# Altium footprint library Connectors.PcbLib: 117 footprints (part 6 of 8)
Each footprint in its own frame and in the unit in brackets; x right, y up, seen from the top. Pads: shape width x height; smd on the part's side, far side on the other; paste and mask are expansions set on the pad; w line width, h text height; cw(c..) or ccw(c..) is an arc to the next point about the centre after c.
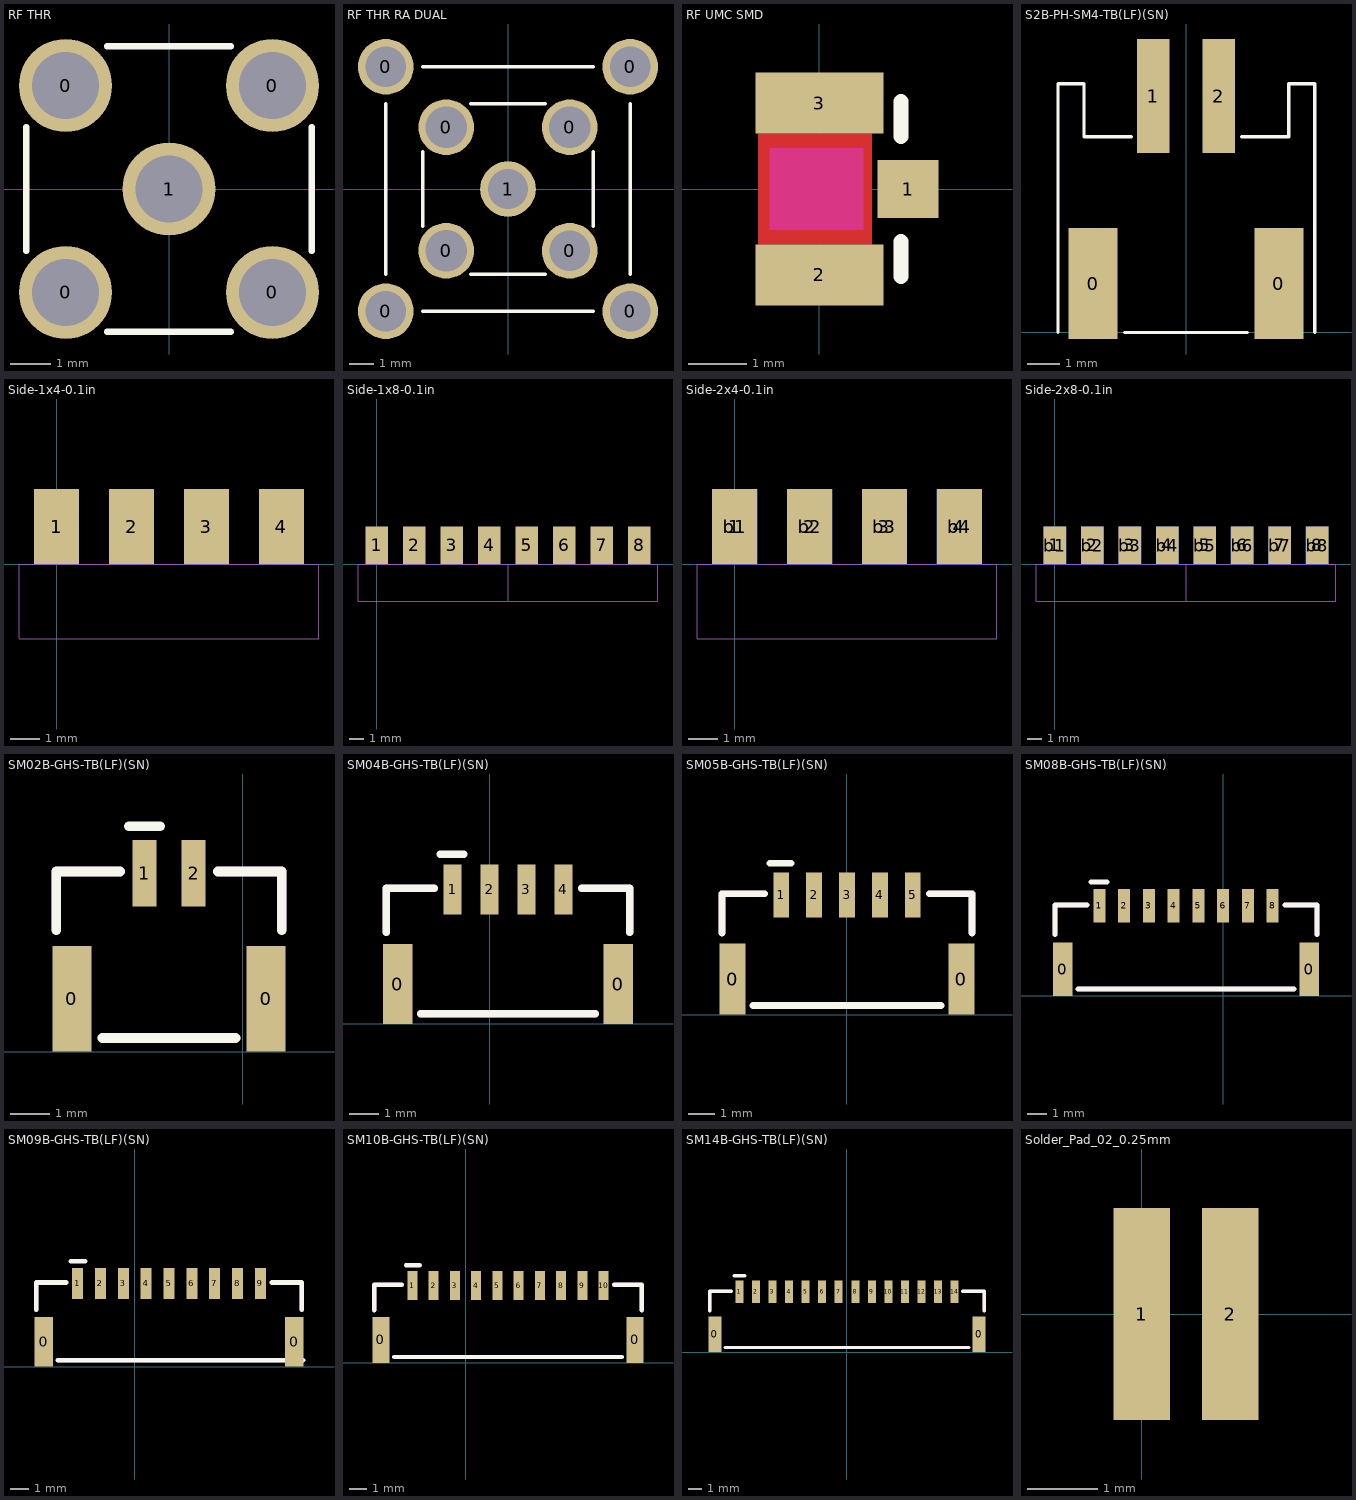
[diagram p5: the footprints below, top view; thin cyan lines are the x and y axes]

## RF THR [mil] "RF .2\" x .2\" Pitch Through Hole"
pads (5):
  round 90 hole 65: 0(-100,-100) 0(-100,100) 0(100,-100) 0(100,100) 1(0,0)
Top Overlay:
  lines w6: -138,-60 -138,60 ; -60,-138 60,-138 ; -60,138 60,138 ; 138,-60 138,60
3D body "User Library-SMA_Stehend_Amp 132134RP-1.STEP": height 375.2, standoff -155, extent -137.79,-137.79 137.8,137.8
3D body "User Library-SMAPLUG-085.step": height 570, standoff 148, extent -159.99,-169.99 160.01,170.01

## RF THR RA DUAL [mil] "RF .2\" x .2\" and .396\" x .396\" Pitch Through Hole Right Angle SMA BNC"
height 732.28
pads (9):
  round 90 hole 65: 0(-197.83,-197.83) 0(-197.83,197.83) 0(100,-100) 0(197.83,-197.83) 0(197.83,197.83) 1(0,0)
  round 90 hole 66.93: 0(-100,-100) 0(-100,100) 0(100,100)
Top Overlay:
  lines w5.98: -197.83,-138 -197.83,138 ; -138,-197.83 138,-197.83 ; -138,197.83 138,197.83 ; 197.83,-138 197.83,138
  lines w6: -138,-60 -138,60 ; -60,-138 60,-138 ; -60,138 60,138 ; 138,-60 138,60
3D body "c-1-1478035-0-b-3d.stp": height 732.28, standoff -167.47, extent -217.52,-666.34 215.55,215.55
3D body "c-2-331350-1-br-3d.stp": height 797.5, standoff 234, extent -278.07,-1340.21 285.43,-258.21

## RF UMC SMD [mm] "Ultra Miniature Coaxial Surface Mount"
height 1.25
pads (3):
  rect 1.05x1 smd: 1(1.525,0)
  rect 2.2x1.05 smd: 2(0,-1.475) 3(0,1.475)
Top Layer:
  pour cut-out: -1.05,0.95 -1.05,-0.95 0.9,-0.95 0.9,0.95
Top Layer keep-out:
  region: -0.85,0.7 -0.85,-0.7 0.75,-0.7 0.75,0.7
Top Overlay:
  lines w0.254: 1.4,-1.5 1.4,-0.9 ; 1.4,0.9 1.4,1.5
3D body "User Library-0734120110 - Molex - UMC Antenna Connector SMT.STEP": height 1.3, standoff 0, extent -1.55,-1.5 1.55,1.5

## S2B-PH-SM4-TB(LF)(SN) [mm]
pads (4):
  rect 1.5x3.4 smd: 0(-2.85,1.5) 0(2.85,1.5)
  rect 1x3.5 smd: 1(-1,7.25) 2(1,7.25)
Top Overlay:
  lines w0.1: -3.925,0 -3.925,7.625 -3.125,7.625 -3.125,6 -1.675,6 ; -1.875,0 1.875,0 ; 1.7,6 3.15,6 3.15,7.625 3.95,7.625 3.95,0
Mechanical 13:
  lines w0.1: -1.7,0 1.7,0
3D body "S2B-PH-SM4-TB.STEP": height 5.6, standoff 0, extent -3.95,0 3.95,8.6

## Side-1x4-0.1in [mil]
pads (4):
  rect 60x100 smd paste-30: 1(0,50) 2(100,50) 3(200,50) 4(300,50)
Mechanical 13:
  lines w1: -50,-100 -50,0 350,0 350,-100 -50,-100
3D body: height 25, standoff 0, extent -12.48,-329.98 12.48,99.98
3D body: height 25, standoff 0, extent 87.52,-329.98 112.48,99.98
3D body: height 25, standoff 0, extent 187.52,-329.98 212.48,99.98
3D body: height 25, standoff 0, extent 287.52,-329.98 312.48,99.98
3D body: height 62.5, standoff -37.5, extent -49.98,-99.98 349.98,-0.02

## Side-1x8-0.1in [mil]
pads (8):
  rect 60x100 smd paste-30: 1(0,50) 2(100,50) 3(200,50) 4(300,50) 5(400,50) 6(500,50) 7(600,50) 8(700,50)
Mechanical 13:
  lines w1: 350,-100 750,-100 750,0 350,0 ; 350,-100 350,0 ; 350,-100 -50,-100 -50,0 350,0 ; 350,-100 350,0
3D body: height 62.5, standoff -37.5, extent 350.02,-99.98 749.98,-0.02
3D body: height 25, standoff 0, extent 687.52,-329.98 712.48,99.98
3D body: height 25, standoff 0, extent 587.52,-329.98 612.48,99.98
3D body: height 25, standoff 0, extent 487.52,-329.98 512.48,99.98
3D body: height 25, standoff 0, extent 387.52,-329.98 412.48,99.98
3D body: height 25, standoff 0, extent -12.48,-329.98 12.48,99.98
3D body: height 25, standoff 0, extent 87.52,-329.98 112.48,99.98
3D body: height 25, standoff 0, extent 187.52,-329.98 212.48,99.98
3D body: height 25, standoff 0, extent 287.52,-329.98 312.48,99.98
3D body: height 62.5, standoff -37.5, extent -49.98,-99.98 349.98,-0.02

## Side-2x4-0.1in [mil]
pads (8):
  rect 60x100 smd paste-30: 1(0,50) 2(100,50) 3(200,50) 4(300,50)
  rect 60x100 smd far side paste-30: b1(0,50) b2(100,50) b3(200,50) b4(300,50)
Mechanical 13:
  lines w1: -50,-100 350,-100 350,0 -50,0 -50,-100
3D body: height -75, standoff -100, extent 287.52,-329.98 312.48,99.98
3D body: height -75, standoff -100, extent 187.52,-329.98 212.48,99.98
3D body: height -75, standoff -100, extent 87.52,-329.98 112.48,99.98
3D body: height -75, standoff -100, extent -12.48,-329.98 12.48,99.98
3D body: height 62.5, standoff -137.5, extent -49.98,-99.98 349.98,-0.02
3D body: height 25, standoff 0, extent 287.52,-329.98 312.48,99.98
3D body: height 25, standoff 0, extent 187.52,-329.98 212.48,99.98
3D body: height 25, standoff 0, extent 87.52,-329.98 112.48,99.98
3D body: height 25, standoff 0, extent -12.48,-329.98 12.48,99.98

## Side-2x8-0.1in [mil]
pads (16):
  rect 60x100 smd paste-30: 1(0,50) 2(100,50) 3(200,50) 4(300,50) 5(400,50) 6(500,50) 7(600,50) 8(700,50)
  rect 60x100 smd far side paste-30: b1(0,50) b2(100,50) b3(200,50) b4(300,50) b5(400,50) b6(500,50) b7(600,50) b8(700,50)
Mechanical 13:
  lines w1: 350,-100 -50,-100 -50,0 350,0 ; 350,-100 350,0 ; 350,-100 750,-100 750,0 350,0 ; 350,-100 350,0
3D body: height 25, standoff 0, extent -12.48,-329.98 12.48,99.98
3D body: height 25, standoff 0, extent 87.52,-329.98 112.48,99.98
3D body: height 25, standoff 0, extent 187.52,-329.98 212.48,99.98
3D body: height 25, standoff 0, extent 287.52,-329.98 312.48,99.98
3D body: height 162.5, standoff -137.5, extent -49.98,-99.98 349.98,-0.02
3D body: height -75, standoff -100, extent -12.48,-329.98 12.48,99.98
3D body: height -75, standoff -100, extent 87.52,-329.98 112.48,99.98
3D body: height -75, standoff -100, extent 187.52,-329.98 212.48,99.98
3D body: height -75, standoff -100, extent 287.52,-329.98 312.48,99.98
3D body: height -75, standoff -100, extent 587.52,-329.98 612.48,99.98
3D body: height -75, standoff -100, extent 487.52,-329.98 512.48,99.98
3D body: height -75, standoff -100, extent 387.52,-329.98 412.48,99.98
3D body: height 162.5, standoff -137.5, extent 350.02,-99.98 749.98,-0.02
3D body: height 125, standoff 100, extent 687.52,-329.98 712.48,99.98
3D body: height 25, standoff 0, extent 587.52,-329.98 612.48,99.98
3D body: height 25, standoff 0, extent 487.52,-329.98 512.48,99.98
3D body: height 25, standoff 0, extent 387.52,-329.98 412.48,99.98
3D body: height 125, standoff 100, extent 587.52,-329.98 612.48,99.98
3D body: height 125, standoff 100, extent 487.52,-329.98 512.48,99.98
3D body: height 125, standoff 100, extent 387.52,-329.98 412.48,99.98
3D body: height 125, standoff 100, extent 287.52,-329.98 312.48,99.98
3D body: height 125, standoff 100, extent 187.52,-329.98 212.48,99.98
3D body: height 125, standoff 100, extent 87.52,-329.98 112.48,99.98
3D body: height 125, standoff 100, extent -12.48,-329.98 12.48,99.98
3D body: height 25, standoff 0, extent 687.52,-329.98 712.48,99.98
3D body: height -75, standoff -100, extent 687.52,-329.98 712.48,99.98
3D body: height 162.5, standoff -137.5, extent -49.98,-649.98 49.98,-100.02
3D body: height 162.5, standoff -137.5, extent 50.02,-649.98 149.98,-100.02
3D body: height 162.5, standoff -137.5, extent 150.02,-649.98 249.98,-100.02
3D body: height 162.5, standoff -137.5, extent 250.02,-649.98 349.98,-100.02

## SM02B-GHS-TB(LF)(SN) [mm] "CONN HEADER GH TOP 15POS 1.25MM"
height 4.35
pads (4):
  rect 1x2.7 smd: 0(-4.35,1.35) 0(0.6,1.35)
  rect 0.6x1.7 smd: 1(-2.5,4.55) 2(-1.25,4.55)
Top Overlay:
  lines w0.254: -4.75,3.1 -4.75,4.6 -3.125,4.6 ; -3.575,0.35 -0.175,0.35 ; -2.9,5.75 -2.1,5.75 ; -0.625,4.6 1,4.6 1,3.1
Mechanical 13:
  lines w0.254: -4.75,3.1 -4.75,4.6 -3.125,4.6 ; -3.575,0.35 -0.175,0.35 ; -0.625,4.6 1,4.6 1,3.1
3D body "SM02B-GHS-TB.STEP": height 4.35, standoff 0, extent -4.75,0.35 1,5.2

## SM04B-GHS-TB(LF)(SN) [mm] "CONN HEADER GH TOP 4POS 1.25MM"
height 4.35
pads (6):
  rect 1x2.7 smd: 0(-3.1,1.35) 0(4.35,1.35)
  rect 0.6x1.7 smd: 1(-1.25,4.55) 2(0,4.55) 3(1.25,4.55) 4(2.5,4.55)
Top Overlay:
  lines w0.254: -3.5,3.1 -3.5,4.6 -1.875,4.6 ; -2.325,0.35 3.575,0.35 ; -1.675,5.75 -0.875,5.75 ; 3.125,4.6 4.75,4.6 4.75,3.1
Mechanical 13:
  lines w0.254: -3.5,3.1 -3.5,4.6 -1.875,4.6 ; -2.325,0.35 3.575,0.35 ; 3.125,4.6 4.75,4.6 4.75,3.1
3D body "SM04B-GHS-TB.STEP": height 4.35, standoff 0, extent -3.5,0.35 4.75,5.2

## SM05B-GHS-TB(LF)(SN) [mm] "CONN HEADER GH TOP 15POS 1.25MM"
height 4.35
pads (7):
  rect 1x2.7 smd: 0(-4.35,1.35) 0(4.35,1.35)
  rect 0.6x1.7 smd: 1(-2.5,4.55) 2(-1.25,4.55) 3(0,4.55) 4(1.25,4.55) 5(2.5,4.55)
Top Overlay:
  lines w0.254: -4.75,3.1 -4.75,4.6 -3.125,4.6 ; -3.575,0.35 3.575,0.35 ; -2.925,5.75 -2.125,5.75 ; 3.125,4.6 4.75,4.6 4.75,3.1
Mechanical 13:
  lines w0.254: -4.75,3.1 -4.75,4.6 -3.125,4.6 ; -3.575,0.35 3.575,0.35 ; 3.125,4.6 4.75,4.6 4.75,3.1
3D body "SM05B-GHS-TB.STEP": height 4.35, standoff 0, extent -4.75,0.35 4.75,5.2

## SM08B-GHS-TB(LF)(SN) [mm] "CONN HEADER GH TOP 8POS 1.25MM"
height 4.35
pads (10):
  rect 1x2.7 smd: 0(-8.1,1.35) 0(4.35,1.35)
  rect 0.6x1.7 smd: 1(-6.25,4.55) 2(-5,4.55) 3(-3.75,4.55) 4(-2.5,4.55) 5(-1.25,4.55) 6(0,4.55) 7(1.25,4.55) 8(2.5,4.55)
Top Overlay:
  lines w0.254: -8.5,3.1 -8.5,4.6 -6.875,4.6 ; -7.325,0.35 3.575,0.35 ; -6.675,5.75 -5.875,5.75 ; 3.125,4.6 4.75,4.6 4.75,3.1
Mechanical 13:
  lines w0.254: -8.5,3.1 -8.5,4.6 -6.875,4.6 ; -7.325,0.35 3.575,0.35 ; 3.125,4.6 4.75,4.6 4.75,3.1
3D body "SM08B-GHS-TB.STEP": height 4.35, standoff 0, extent -8.5,0.35 4.75,5.2

## SM09B-GHS-TB(LF)(SN) [mm] "CONN HEADER GH TOP 9POS 1.25MM"
height 4.35
pads (11):
  rect 1x2.7 smd: 0(-4.975,1.35) 0(8.725,1.35)
  rect 0.6x1.7 smd: 1(-3.125,4.55) 2(-1.875,4.55) 3(-0.625,4.55) 4(0.625,4.55) 5(1.875,4.55) 6(3.125,4.55) 7(4.375,4.55) 8(5.625,4.55) 9(6.875,4.55)
Top Overlay:
  lines w0.254: -5.375,3.1 -5.375,4.6 -3.75,4.6 ; -4.2,0.35 9.2,0.35 ; -3.5,5.75 -2.7,5.75 ; 7.5,4.6 9.125,4.6 9.125,3.1
Mechanical 13:
  lines w0.254: -5.375,3.1 -5.375,4.6 -3.75,4.6 ; -4.2,0.35 9.2,0.35 ; 7.5,4.6 9.125,4.6 9.125,3.1
3D body "SM09B-GHS-TB.STEP": height 4.35, standoff 0, extent -5.375,0.35 9.125,5.2

## SM10B-GHS-TB(LF)(SN) [mm] "CONN HEADER GH TOP 10POS 1.25MM"
height 4.35
pads (12):
  rect 1x2.7 smd: 0(-4.975,1.35) 0(9.975,1.35)
  rect 0.6x1.7 smd: 1(-3.125,4.55) 2(-1.875,4.55) 3(-0.625,4.55) 4(0.625,4.55) 5(1.875,4.55) 6(3.125,4.55) 7(4.375,4.55) 8(5.625,4.55) 9(6.875,4.55) 10(8.125,4.55)
Top Overlay:
  lines w0.254: -5.375,3.1 -5.375,4.6 -3.75,4.6 ; -4.2,0.35 9.2,0.35 ; -3.5,5.75 -2.7,5.75 ; 8.75,4.6 10.375,4.6 10.375,3.1
Mechanical 13:
  lines w0.254: -5.375,3.1 -5.375,4.6 -3.75,4.6 ; -4.2,0.35 9.2,0.35 ; 8.75,4.6 10.375,4.6 10.375,3.1
3D body "SM10B-GHS-TB.STEP": height 4.35, standoff 0, extent -5.375,0.35 10.375,5.2

## SM14B-GHS-TB(LF)(SN) [mm] "CONN HEADER GH TOP 15POS 1.25MM"
height 4.35
pads (16):
  rect 1x2.7 smd: 0(-9.975,1.35) 0(9.975,1.35)
  rect 0.6x1.7 smd: 1(-8.125,4.55) 2(-6.875,4.55) 3(-5.625,4.55) 4(-4.375,4.55) 5(-3.125,4.55) 6(-1.875,4.55) 7(-0.625,4.55) 8(0.625,4.55) 9(1.875,4.55) 10(3.125,4.55) 11(4.375,4.55) 12(5.625,4.55) 13(6.875,4.55) 14(8.125,4.55)
Top Overlay:
  lines w0.254: -10.375,3.1 -10.375,4.6 -8.75,4.6 ; -9.2,0.35 9.2,0.35 ; -8.5,5.75 -7.7,5.75 ; 8.75,4.6 10.375,4.6 10.375,3.1
Mechanical 13:
  lines w0.254: -10.375,3.1 -10.375,4.6 -8.75,4.6 ; -9.2,0.35 9.2,0.35 ; 8.75,4.6 10.375,4.6 10.375,3.1
3D body "SM14B-GHS-TB.STEP": height 4.35, standoff 0, extent -10.375,0.35 10.375,5.2

## Solder_Pad_02_0.25mm [mm] "Two parallel solder pads, 1.25 mm pitch, for wire connection"
pads (2):
  rect 0.8x3 smd: 1(0,0) 2(1.25,0)